# Altium footprint library 2.52-直插元件.PcbLib: 467 footprints (part 19 of 30)
Each footprint in its own frame and in the unit in brackets; x right, y up, seen from the top. Pads: shape width x height; smd on the part's side, far side on the other; paste and mask are expansions set on the pad; w line width, h text height; cw(c..) or ccw(c..) is an arc to the next point about the centre after c.
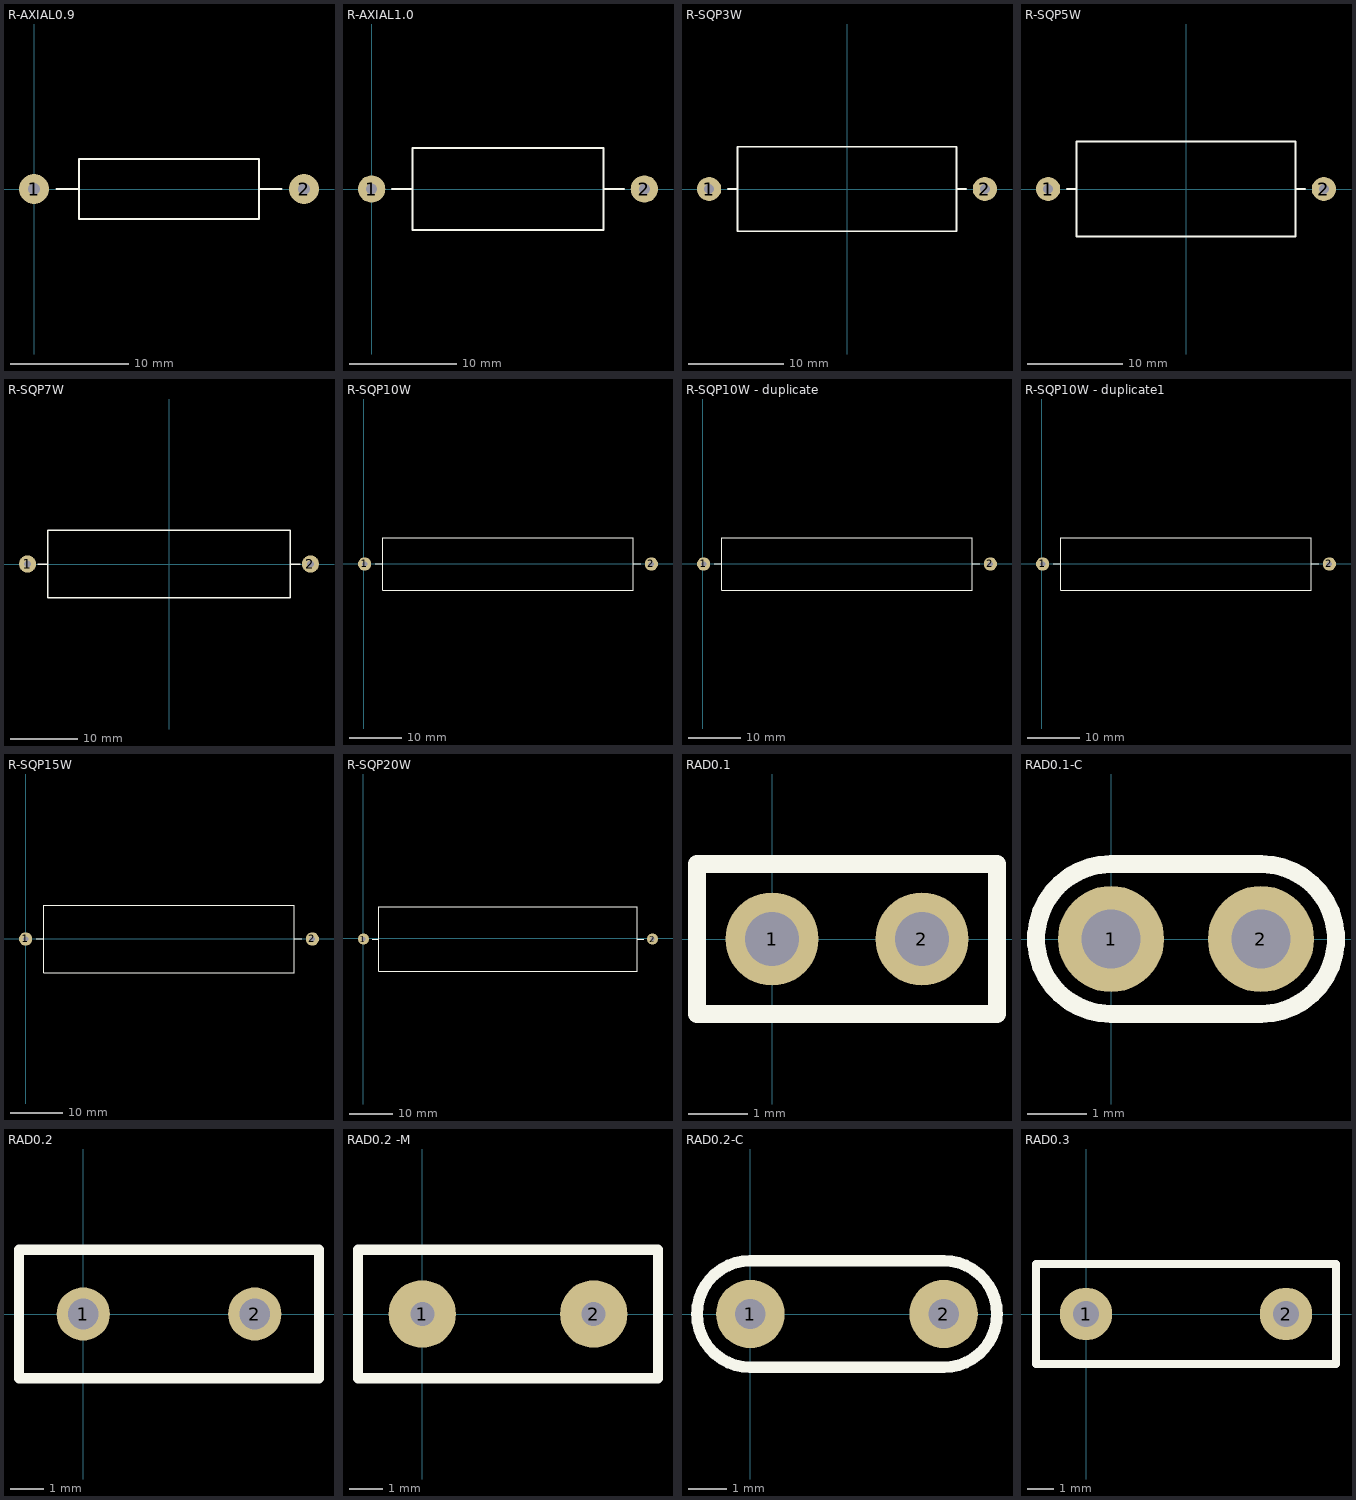
[diagram p18: the footprints below, top view; thin cyan lines are the x and y axes]

## R-AXIAL0.9 [mil]
pads (2):
  round 100 hole 40: 1(0,0) 2(900,0)
Top Overlay:
  lines w8: 75,0 150,0 ; 750,0 825,0 ; 150,-100 150,100 750,100 750,-100 150,-100

## R-AXIAL1.0 [mil]
pads (2):
  round 100 hole 40: 1(0,0) 2(1000,0)
Top Overlay:
  lines w8: 75,0 150,0 ; 850,0 925,0 ; 150,-150 850,-150 850,150 150,150 150,-150

## R-SQP3W [mm]
pads (2):
  round 2.54 hole 1.016: 1(-14.5,0) 2(14.5,0)
Top Overlay:
  lines w0.203: -12.5,0 -11.5,0 ; 11.5,0 12.5,0 ; -11.5,-4.445 -11.5,4.445 11.5,4.445 11.5,-4.445 -11.5,-4.445

## R-SQP5W [mm]
pads (2):
  round 2.54 hole 1.016: 1(-14.5,0) 2(14.5,0)
Top Overlay:
  lines w0.203: -12.5,0 -11.5,0 ; 11.5,0 12.5,0 ; -11.5,-5 -11.5,5 11.5,5 11.5,-5 -11.5,-5

## R-SQP7W [mm]
pads (2):
  round 2.54 hole 1.016: 1(-21,0) 2(21,0)
Top Overlay:
  lines w0.203: -19.5,0 -18,0 ; 18,0 19.5,0 ; -18,-5 18,-5 18,5 -18,5 -18,-5

## R-SQP10W [mil]
pads (2):
  round 100 hole 40: 1(4.82,-2.5) 2(2170.18,-2.5)
Top Overlay:
  lines w8: 83.56,-2.5 142.62,-2.5 ; 2032.38,-2.5 2091.44,-2.5 ; 142.62,-199.35 2032.38,-199.35 2032.38,194.35 142.62,194.35 142.62,-199.35

## R-SQP10W - duplicate [mil]
pads (2):
  round 100 hole 40: 1(4.82,-2.5) 2(2170.18,-2.5)
Top Overlay:
  lines w8: 83.56,-2.5 142.62,-2.5 ; 2032.38,-2.5 2091.44,-2.5 ; 142.62,-199.35 2032.38,-199.35 2032.38,194.35 142.62,194.35 142.62,-199.35

## R-SQP10W - duplicate1 [mil]
pads (2):
  round 100 hole 40: 1(4.82,-2.5) 2(2170.18,-2.5)
Top Overlay:
  lines w8: 83.56,-2.5 142.62,-2.5 ; 2032.38,-2.5 2091.44,-2.5 ; 142.62,-199.35 2032.38,-199.35 2032.38,194.35 142.62,194.35 142.62,-199.35

## R-SQP15W [mil]
pads (2):
  round 100 hole 40: 1(-0.18,-2.5) 2(2165.18,-2.5)
Top Overlay:
  lines w8: 78.56,-2.5 137.62,-2.5 ; 2027.38,-2.5 2086.44,-2.5 ; 137.62,-258.41 2027.38,-258.41 2027.38,253.41 137.62,253.41 137.62,-258.41

## R-SQP20W [mil]
pads (2):
  round 100 hole 40: 1(3.6,-5) 2(2641.4,-5)
Top Overlay:
  lines w8: 82.34,-5 141.4,-5 ; 2503.6,-5 2562.66,-5 ; 141.4,-300.28 2503.6,-300.28 2503.6,290.28 141.4,290.28 141.4,-300.28

## RAD0.1 [mil]
pads (2):
  round 62 hole 36: 1(0,0) 2(100,0)
Top Overlay:
  lines w12: -50,-50 150,-50 150,50 -50,50 -50,-50

## RAD0.1-C [mm]
pads (2):
  round 1.8 hole 1: 1(0,0) 2(2.54,0)
Top Overlay:
  lines w0.305: 0,-1.27 cw(c0,0) 0,1.27 2.54,1.27 cw(c2.54,0) 2.54,-1.27 0,-1.27

## RAD0.2 [mil]
pads (2):
  round 62 hole 36: 1(0,0) 2(200,0)
Top Overlay:
  lines w12: -75,-75 275,-75 275,75 -75,75 -75,-75

## RAD0.2 -M [mm]
pads (2):
  round 2 hole 0.711: 1(0,0) 2(5.08,0)
Top Overlay:
  lines w0.305: -1.905,-1.905 -1.905,1.905 6.985,1.905 6.985,-1.905 -1.905,-1.905

## RAD0.2-C [mm]
pads (2):
  round 1.8 hole 0.8: 1(0,0) 2(5.08,0)
Top Overlay:
  lines w0.305: 0,-1.403 cw(c0,0) 0,1.403 5.08,1.403 cw(c5.08,0) 5.08,-1.403 0,-1.403

## RAD0.3 [mm]
pads (2):
  round 2 hole 1: 1(0,0) 2(7.62,0)
Top Overlay:
  lines w0.305: -1.905,-1.905 -1.905,1.905 9.525,1.905 9.525,-1.905 -1.905,-1.905